# Altium footprint library rescap.PcbLib: 106 footprints (part 5 of 7)
Each footprint in its own frame and in the unit in brackets; x right, y up, seen from the top. Pads: shape width x height; smd on the part's side, far side on the other; paste and mask are expansions set on the pad; w line width, h text height; cw(c..) or ccw(c..) is an arc to the next point about the centre after c.
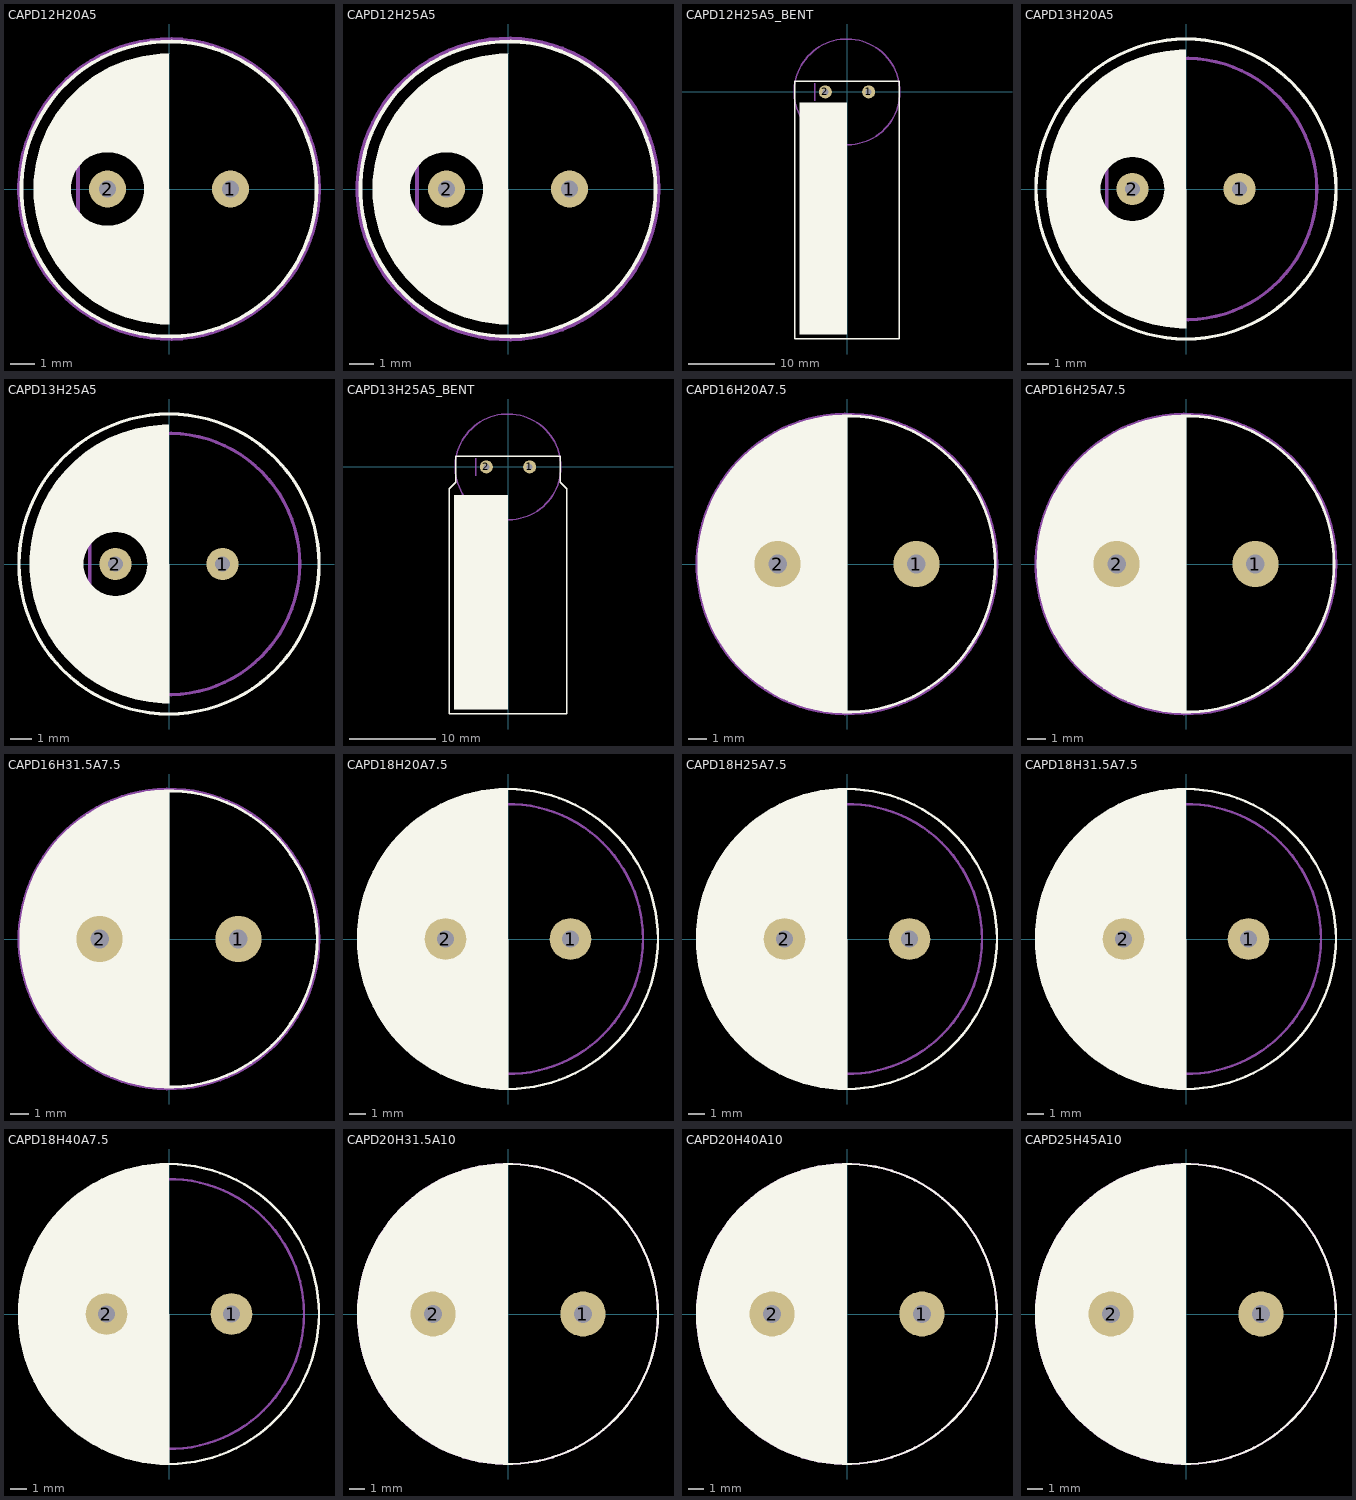
[diagram p4: the footprints below, top view; thin cyan lines are the x and y axes]

## CAPD12H20A5 [mm]
height 20
pads (2):
  round 1.5 hole 0.7: 1(2.5,0) 2(-2.5,0)
Top Overlay:
  circle w0.15: c0,0 r6
  region: 0,5.5 0,-5.5 -0.36,-5.5 -1.075,-5.406 -1.772,-5.219 -2.438,-4.943 -3.062,-4.583 -3.634,-4.144 -4.144,-3.634 -4.583,-3.062 -4.943,-2.438 -5.219,-1.772 -5.406,-1.075 -5.5,-0.36 -5.5,0 -4,0 -3.993,-0.147 -3.935,-0.435 -3.823,-0.707 -3.66,-0.952 -3.452,-1.16 -3.207,-1.323 -2.935,-1.435 -2.647,-1.493 -2.5,-1.5 -2.353,-1.493 -2.065,-1.435 -1.793,-1.323 -1.548,-1.16 -1.34,-0.952 -1.177,-0.707 -1.065,-0.435 -1.007,-0.147 -1,0 -1.007,0.147 -1.065,0.435 -1.177,0.707 -1.34,0.952 -1.548,1.16 -1.793,1.323 -2.065,1.435 -2.353,1.493 -2.5,1.5 -2.647,1.493 -2.935,1.435 -3.207,1.323 -3.452,1.16 -3.66,0.952 -3.823,0.707 -3.935,0.435 -3.993,0.147 -4,0 -5.5,0 -5.5,0.36 -5.406,1.075 -5.219,1.772 -4.943,2.438 -4.583,3.062 -4.144,3.634 -3.634,4.144 -3.062,4.583 -2.438,4.943 -1.772,5.219 -1.075,5.406 -0.36,5.5
Mechanical 29:
  circle w0.15: c0,0 r6.1
  lines w0.15: -3.7,-1 -3.7,0 -3.7,1
  text ".Designator" at -2.8,-0.4 h1
3D body: height 20, standoff 0, extent -6,-6 6,6

## CAPD12H25A5 [mm]
height 25
pads (2):
  round 1.5 hole 0.7: 1(2.5,0) 2(-2.5,0)
Top Overlay:
  circle w0.15: c0,0 r6
  region: 0,5.5 0,-5.5 -0.36,-5.5 -1.075,-5.406 -1.772,-5.219 -2.438,-4.943 -3.062,-4.583 -3.634,-4.144 -4.144,-3.634 -4.583,-3.062 -4.943,-2.438 -5.219,-1.772 -5.406,-1.075 -5.5,-0.36 -5.5,0 -4,0 -3.993,-0.147 -3.935,-0.435 -3.823,-0.707 -3.66,-0.952 -3.452,-1.16 -3.207,-1.323 -2.935,-1.435 -2.647,-1.493 -2.5,-1.5 -2.353,-1.493 -2.065,-1.435 -1.793,-1.323 -1.548,-1.16 -1.34,-0.952 -1.177,-0.707 -1.065,-0.435 -1.007,-0.147 -1,0 -1.007,0.147 -1.065,0.435 -1.177,0.707 -1.34,0.952 -1.548,1.16 -1.793,1.323 -2.065,1.435 -2.353,1.493 -2.5,1.5 -2.647,1.493 -2.935,1.435 -3.207,1.323 -3.452,1.16 -3.66,0.952 -3.823,0.707 -3.935,0.435 -3.993,0.147 -4,0 -5.5,0 -5.5,0.36 -5.406,1.075 -5.219,1.772 -4.943,2.438 -4.583,3.062 -4.144,3.634 -3.634,4.144 -3.062,4.583 -2.438,4.943 -1.772,5.219 -1.075,5.406 -0.36,5.5
Top Courtyard:
  circle w0.2: c0,0 r6.1
Mechanical 29:
  circle w0.15: c0,0 r6.101
  lines w0.15: -3.7,-1 -3.7,0 -3.7,1
  text ".Designator" at -2.6,-0.3 h1
3D body: height 25, standoff 0, extent -6,-6 6,6

## CAPD12H25A5_BENT [mm]
pads (2):
  round 1.5 hole 0.7: 1(2.5,0) 2(-2.5,0)
Top Overlay:
  rectangle: -5.5,-28 0,-1.25
  lines w0.15: -6,-28.5 6,-28.5 6,0.25 6,1.25 -6,1.25 -6,0 -6,-28.5
Mechanical 29:
  circle w0.15: c0,0 r6.101
  lines w0.15: -3.7,-1 -3.7,0 -3.7,1
  text ".Designator" at -2.6,-0.3 h1
3D body: height 12, standoff 0, extent -6,-28.25 6,-3.25
3D body: height 6.35, standoff 5.65, extent -2.85,-3.275 -2.15,-0.075
3D body: height 6.35, standoff 5.65, extent 2.15,-3.275 2.85,-0.075
3D body: height 6.35, standoff -1, extent -2.85,-0.35 -2.15,0.35
3D body: height 6.35, standoff -1, extent 2.15,-0.35 2.85,0.35

## CAPD13H20A5 [mm]
pads (2):
  round 1.5 hole 0.7: 1(2.5,0) 2(-2.5,0)
Top Overlay:
  circle w0.15: c0,0 r7
  region: 0,6.5 0,-6.5 -0.319,-6.5 -0.955,-6.437 -1.581,-6.313 -2.192,-6.127 -2.782,-5.883 -3.346,-5.582 -3.877,-5.227 -4.37,-4.822 -4.822,-4.37 -5.227,-3.877 -5.582,-3.346 -5.883,-2.782 -6.127,-2.192 -6.313,-1.581 -6.437,-0.955 -6.5,-0.319 -6.5,0 -4,0 -3.993,-0.147 -3.935,-0.435 -3.823,-0.707 -3.66,-0.952 -3.452,-1.16 -3.207,-1.323 -2.935,-1.435 -2.647,-1.493 -2.5,-1.5 -2.353,-1.493 -2.065,-1.435 -1.793,-1.323 -1.548,-1.16 -1.34,-0.952 -1.177,-0.707 -1.065,-0.435 -1.007,-0.147 -1,0 -1.007,0.147 -1.065,0.435 -1.177,0.707 -1.34,0.952 -1.548,1.16 -1.793,1.323 -2.065,1.435 -2.353,1.493 -2.5,1.5 -2.647,1.493 -2.935,1.435 -3.207,1.323 -3.452,1.16 -3.66,0.952 -3.823,0.707 -3.935,0.435 -3.993,0.147 -4,0 -6.5,0 -6.5,0.319 -6.437,0.955 -6.313,1.581 -6.127,2.192 -5.883,2.782 -5.582,3.346 -5.227,3.877 -4.822,4.37 -4.37,4.822 -3.877,5.227 -3.346,5.582 -2.782,5.883 -2.192,6.127 -1.581,6.313 -0.955,6.437 -0.319,6.5
Mechanical 29:
  circle w0.15: c0,0 r6.101
  lines w0.15: -3.7,-1 -3.7,0 -3.7,1
  text ".Designator" at -2.6,-0.3 h1
3D body: height 20, standoff 0, extent -6.5,-6.5 6.5,6.5

## CAPD13H25A5 [mm]
pads (2):
  round 1.5 hole 0.7: 1(2.5,0) 2(-2.5,0)
Top Overlay:
  circle w0.15: c0,0 r7
  region: 0,6.5 0,-6.5 -0.319,-6.5 -0.955,-6.437 -1.581,-6.313 -2.192,-6.127 -2.782,-5.883 -3.346,-5.582 -3.877,-5.227 -4.37,-4.822 -4.822,-4.37 -5.227,-3.877 -5.582,-3.346 -5.883,-2.782 -6.127,-2.192 -6.313,-1.581 -6.437,-0.955 -6.5,-0.319 -6.5,0 -4,0 -3.993,-0.147 -3.935,-0.435 -3.823,-0.707 -3.66,-0.952 -3.452,-1.16 -3.207,-1.323 -2.935,-1.435 -2.647,-1.493 -2.5,-1.5 -2.353,-1.493 -2.065,-1.435 -1.793,-1.323 -1.548,-1.16 -1.34,-0.952 -1.177,-0.707 -1.065,-0.435 -1.007,-0.147 -1,0 -1.007,0.147 -1.065,0.435 -1.177,0.707 -1.34,0.952 -1.548,1.16 -1.793,1.323 -2.065,1.435 -2.353,1.493 -2.5,1.5 -2.647,1.493 -2.935,1.435 -3.207,1.323 -3.452,1.16 -3.66,0.952 -3.823,0.707 -3.935,0.435 -3.993,0.147 -4,0 -6.5,0 -6.5,0.319 -6.437,0.955 -6.313,1.581 -6.127,2.192 -5.883,2.782 -5.582,3.346 -5.227,3.877 -4.822,4.37 -4.37,4.822 -3.877,5.227 -3.346,5.582 -2.782,5.883 -2.192,6.127 -1.581,6.313 -0.955,6.437 -0.319,6.5
Mechanical 29:
  circle w0.15: c0,0 r6.101
  lines w0.15: -3.7,-1 -3.7,0 -3.7,1
  text ".Designator" at -2.6,-0.3 h1
3D body: height 25, standoff 0, extent -6.5,-6.5 6.5,6.5

## CAPD13H25A5_BENT [mm]
pads (2):
  round 1.5 hole 0.7: 1(2.5,0) 2(-2.5,0)
Top Overlay:
  rectangle: -6.25,-28 0,-3.25
  lines w0.15: -6.75,-28.5 -6.75,-2.5 -6,-1.75 -6,1.25 6,1.25 6,-1.75 6.75,-2.5 6.75,-28.5 -6.75,-28.5
Mechanical 29:
  circle w0.15: c0,0 r6.101
  lines w0.15: -3.7,-1 -3.7,0 -3.7,1
  text ".Designator" at -2.6,-0.3 h1
3D body: height 6.35, standoff -1, extent 2.15,-0.35 2.85,0.35
3D body: height 6.35, standoff -1, extent -2.85,-0.35 -2.15,0.35
3D body: height 6.35, standoff 5.65, extent 2.15,-3.275 2.85,-0.075
3D body: height 6.35, standoff 5.65, extent -2.85,-3.275 -2.15,-0.075
3D body: height 12.5, standoff -0.5, extent -6.5,-28.25 6.5,-3.25

## CAPD16H20A7.5 [mm]
height 20
pads (2):
  round 2.5 hole 1: 1(3.75,0) 2(-3.75,0)
Top Overlay:
  circle w0.15: c0,0 r8
  region: 0,-8 -0.393,-8 -1.175,-7.923 -1.946,-7.77 -2.698,-7.541 -3.425,-7.241 -4.118,-6.87 -4.771,-6.433 -5.379,-5.935 -5.935,-5.379 -6.433,-4.771 -6.87,-4.118 -7.241,-3.425 -7.541,-2.698 -7.77,-1.946 -7.923,-1.175 -8,-0.393 -8,0 -8,0.393 -7.923,1.175 -7.77,1.946 -7.541,2.698 -7.241,3.425 -6.87,4.118 -6.433,4.771 -5.935,5.379 -5.379,5.935 -4.771,6.433 -4.118,6.87 -3.425,7.241 -2.698,7.541 -1.946,7.77 -1.175,7.923 -0.393,8 0,8
  pour cut-out: -3.75,-1.75 -3.922,-1.75 -4.26,-1.683 -4.579,-1.551 -4.866,-1.359 -5.109,-1.116 -5.301,-0.829 -5.433,-0.51 -5.5,-0.172 -5.5,0 -5.5,0.172 -5.433,0.51 -5.301,0.829 -5.109,1.116 -4.866,1.359 -4.579,1.551 -4.26,1.683 -3.922,1.75 -3.75,1.75 -3.578,1.75 -3.24,1.683 -2.921,1.551 -2.634,1.359 -2.391,1.116 -2.199,0.829 -2.067,0.51 -2,0.172 -2,0 -2,-0.172 -2.067,-0.51 -2.199,-0.829 -2.391,-1.116 -2.634,-1.359 -2.921,-1.551 -3.24,-1.683 -3.578,-1.75
Mechanical 29:
  circle w0.15: c0,0 r8.1
  lines w0.15: -3.7,-1 -3.7,0 -3.7,1
  text ".Designator" at -2.2,-0.4 h1
3D body: height 20, standoff 0, extent -7.999,-7.999 7.999,7.999

## CAPD16H25A7.5 [mm]
height 25
pads (2):
  round 2.5 hole 1: 1(3.75,0) 2(-3.75,0)
Top Overlay:
  circle w0.15: c0,0 r8
  region: 0,-8 -0.393,-8 -1.175,-7.923 -1.946,-7.77 -2.698,-7.541 -3.425,-7.241 -4.118,-6.87 -4.771,-6.433 -5.379,-5.935 -5.935,-5.379 -6.433,-4.771 -6.87,-4.118 -7.241,-3.425 -7.541,-2.698 -7.77,-1.946 -7.923,-1.175 -8,-0.393 -8,0 -8,0.393 -7.923,1.175 -7.77,1.946 -7.541,2.698 -7.241,3.425 -6.87,4.118 -6.433,4.771 -5.935,5.379 -5.379,5.935 -4.771,6.433 -4.118,6.87 -3.425,7.241 -2.698,7.541 -1.946,7.77 -1.175,7.923 -0.393,8 0,8
  pour cut-out: -3.75,-1.75 -3.922,-1.75 -4.26,-1.683 -4.579,-1.551 -4.866,-1.359 -5.109,-1.116 -5.301,-0.829 -5.433,-0.51 -5.5,-0.172 -5.5,0 -5.5,0.172 -5.433,0.51 -5.301,0.829 -5.109,1.116 -4.866,1.359 -4.579,1.551 -4.26,1.683 -3.922,1.75 -3.75,1.75 -3.578,1.75 -3.24,1.683 -2.921,1.551 -2.634,1.359 -2.391,1.116 -2.199,0.829 -2.067,0.51 -2,0.172 -2,0 -2,-0.172 -2.067,-0.51 -2.199,-0.829 -2.391,-1.116 -2.634,-1.359 -2.921,-1.551 -3.24,-1.683 -3.578,-1.75
Mechanical 29:
  circle w0.15: c0,0 r8.101
  lines w0.15: -3.7,-1 -3.7,0 -3.7,1
  text ".Designator" at -2.4,-0.3 h1
3D body: height 25, standoff 0, extent -7.999,-7.999 7.999,7.999

## CAPD16H31.5A7.5 [mm]
height 31.5
pads (2):
  round 2.5 hole 1: 1(3.75,0) 2(-3.75,0)
Top Overlay:
  circle w0.15: c0,0 r8
  region: 0,-8 -0.393,-8 -1.175,-7.923 -1.946,-7.77 -2.698,-7.541 -3.425,-7.241 -4.118,-6.87 -4.771,-6.433 -5.379,-5.935 -5.935,-5.379 -6.433,-4.771 -6.87,-4.118 -7.241,-3.425 -7.541,-2.698 -7.77,-1.946 -7.923,-1.175 -8,-0.393 -8,0 -8,0.393 -7.923,1.175 -7.77,1.946 -7.541,2.698 -7.241,3.425 -6.87,4.118 -6.433,4.771 -5.935,5.379 -5.379,5.935 -4.771,6.433 -4.118,6.87 -3.425,7.241 -2.698,7.541 -1.946,7.77 -1.175,7.923 -0.393,8 0,8
  pour cut-out: -3.75,-1.75 -3.922,-1.75 -4.26,-1.683 -4.579,-1.551 -4.866,-1.359 -5.109,-1.116 -5.301,-0.829 -5.433,-0.51 -5.5,-0.172 -5.5,0 -5.5,0.172 -5.433,0.51 -5.301,0.829 -5.109,1.116 -4.866,1.359 -4.579,1.551 -4.26,1.683 -3.922,1.75 -3.75,1.75 -3.578,1.75 -3.24,1.683 -2.921,1.551 -2.634,1.359 -2.391,1.116 -2.199,0.829 -2.067,0.51 -2,0.172 -2,0 -2,-0.172 -2.067,-0.51 -2.199,-0.829 -2.391,-1.116 -2.634,-1.359 -2.921,-1.551 -3.24,-1.683 -3.578,-1.75
Mechanical 29:
  circle w0.15: c0,0 r8.1
  lines w0.15: -3.7,-1 -3.7,0 -3.7,1
  text ".Designator" at -2.3,-0.2 h1
3D body: height 31.5, standoff 0, extent -7.999,-7.999 7.999,7.999

## CAPD18H20A7.5 [mm]
height 20
pads (2):
  round 2.5 hole 1: 1(3.75,0) 2(-3.75,0)
Top Overlay:
  circle w0.15: c0,0 r9
  pour cut-out: -3.75,-1.75 -3.922,-1.75 -4.26,-1.683 -4.579,-1.551 -4.866,-1.359 -5.109,-1.116 -5.301,-0.829 -5.433,-0.51 -5.5,-0.172 -5.5,0 -5.5,0.172 -5.433,0.51 -5.301,0.829 -5.109,1.116 -4.866,1.359 -4.579,1.551 -4.26,1.683 -3.922,1.75 -3.75,1.75 -3.578,1.75 -3.24,1.683 -2.921,1.551 -2.634,1.359 -2.391,1.116 -2.199,0.829 -2.067,0.51 -2,0.172 -2,0 -2,-0.172 -2.067,-0.51 -2.199,-0.829 -2.391,-1.116 -2.634,-1.359 -2.921,-1.551 -3.24,-1.683 -3.578,-1.75
  region: 0,-9 -0.442,-9 -1.322,-8.913 -2.189,-8.741 -3.036,-8.484 -3.853,-8.146 -4.633,-7.729 -5.368,-7.238 -6.051,-6.677 -6.677,-6.051 -7.238,-5.368 -7.729,-4.633 -8.146,-3.853 -8.484,-3.036 -8.741,-2.189 -8.913,-1.322 -9,-0.442 -9,0 -9,0.442 -8.913,1.322 -8.741,2.189 -8.484,3.036 -8.146,3.853 -7.729,4.632 -7.238,5.368 -6.677,6.051 -6.051,6.677 -5.368,7.238 -4.633,7.729 -3.853,8.146 -3.036,8.484 -2.189,8.741 -1.322,8.913 -0.442,9 0,9
Mechanical 29:
  circle w0.15: c0,0 r8.1
  lines w0.15: -3.7,-1 -3.7,0 -3.7,1
  text ".Designator" at -2.2,-0.4 h1
3D body: height 20, standoff 0, extent -9,-9 9,9

## CAPD18H25A7.5 [mm]
height 25
pads (2):
  round 2.5 hole 1: 1(3.75,0) 2(-3.75,0)
Top Overlay:
  circle w0.15: c0,0 r9
  pour cut-out: -3.75,-1.75 -3.922,-1.75 -4.26,-1.683 -4.579,-1.551 -4.866,-1.359 -5.109,-1.116 -5.301,-0.829 -5.433,-0.51 -5.5,-0.172 -5.5,0 -5.5,0.172 -5.433,0.51 -5.301,0.829 -5.109,1.116 -4.866,1.359 -4.579,1.551 -4.26,1.683 -3.922,1.75 -3.75,1.75 -3.578,1.75 -3.24,1.683 -2.921,1.551 -2.634,1.359 -2.391,1.116 -2.199,0.829 -2.067,0.51 -2,0.172 -2,0 -2,-0.172 -2.067,-0.51 -2.199,-0.829 -2.391,-1.116 -2.634,-1.359 -2.921,-1.551 -3.24,-1.683 -3.578,-1.75
  region: 0,-9 -0.442,-9 -1.322,-8.913 -2.189,-8.741 -3.036,-8.484 -3.853,-8.146 -4.633,-7.729 -5.368,-7.238 -6.051,-6.677 -6.677,-6.051 -7.238,-5.368 -7.729,-4.633 -8.146,-3.853 -8.484,-3.036 -8.741,-2.189 -8.913,-1.322 -9,-0.442 -9,0 -9,0.442 -8.913,1.322 -8.741,2.189 -8.484,3.036 -8.146,3.853 -7.729,4.632 -7.238,5.368 -6.677,6.051 -6.051,6.677 -5.368,7.238 -4.633,7.729 -3.853,8.146 -3.036,8.484 -2.189,8.741 -1.322,8.913 -0.442,9 0,9
Mechanical 29:
  circle w0.15: c0,0 r8.1
  lines w0.15: -3.7,-1 -3.7,0 -3.7,1
  text ".Designator" at -2.2,-0.4 h1
3D body: height 25, standoff 0, extent -9,-9 9,9

## CAPD18H31.5A7.5 [mm]
height 25
pads (2):
  round 2.5 hole 1: 1(3.75,0) 2(-3.75,0)
Top Overlay:
  circle w0.15: c0,0 r9
  pour cut-out: -3.75,-1.75 -3.922,-1.75 -4.26,-1.683 -4.579,-1.551 -4.866,-1.359 -5.109,-1.116 -5.301,-0.829 -5.433,-0.51 -5.5,-0.172 -5.5,0 -5.5,0.172 -5.433,0.51 -5.301,0.829 -5.109,1.116 -4.866,1.359 -4.579,1.551 -4.26,1.683 -3.922,1.75 -3.75,1.75 -3.578,1.75 -3.24,1.683 -2.921,1.551 -2.634,1.359 -2.391,1.116 -2.199,0.829 -2.067,0.51 -2,0.172 -2,0 -2,-0.172 -2.067,-0.51 -2.199,-0.829 -2.391,-1.116 -2.634,-1.359 -2.921,-1.551 -3.24,-1.683 -3.578,-1.75
  region: 0,-9 -0.442,-9 -1.322,-8.913 -2.189,-8.741 -3.036,-8.484 -3.853,-8.146 -4.633,-7.729 -5.368,-7.238 -6.051,-6.677 -6.677,-6.051 -7.238,-5.368 -7.729,-4.633 -8.146,-3.853 -8.484,-3.036 -8.741,-2.189 -8.913,-1.322 -9,-0.442 -9,0 -9,0.442 -8.913,1.322 -8.741,2.189 -8.484,3.036 -8.146,3.853 -7.729,4.632 -7.238,5.368 -6.677,6.051 -6.051,6.677 -5.368,7.238 -4.633,7.729 -3.853,8.146 -3.036,8.484 -2.189,8.741 -1.322,8.913 -0.442,9 0,9
Mechanical 29:
  circle w0.15: c0,0 r8.1
  lines w0.15: -3.7,-1 -3.7,0 -3.7,1
  text ".Designator" at -2.2,-0.4 h1
3D body: height 31.5, standoff 0, extent -9,-9 9,9

## CAPD18H40A7.5 [mm]
height 25
pads (2):
  round 2.5 hole 1: 1(3.75,0) 2(-3.75,0)
Top Overlay:
  circle w0.15: c0,0 r9
  pour cut-out: -3.75,-1.75 -3.922,-1.75 -4.26,-1.683 -4.579,-1.551 -4.866,-1.359 -5.109,-1.116 -5.301,-0.829 -5.433,-0.51 -5.5,-0.172 -5.5,0 -5.5,0.172 -5.433,0.51 -5.301,0.829 -5.109,1.116 -4.866,1.359 -4.579,1.551 -4.26,1.683 -3.922,1.75 -3.75,1.75 -3.578,1.75 -3.24,1.683 -2.921,1.551 -2.634,1.359 -2.391,1.116 -2.199,0.829 -2.067,0.51 -2,0.172 -2,0 -2,-0.172 -2.067,-0.51 -2.199,-0.829 -2.391,-1.116 -2.634,-1.359 -2.921,-1.551 -3.24,-1.683 -3.578,-1.75
  region: 0,-9 -0.442,-9 -1.322,-8.913 -2.189,-8.741 -3.036,-8.484 -3.853,-8.146 -4.633,-7.729 -5.368,-7.238 -6.051,-6.677 -6.677,-6.051 -7.238,-5.368 -7.729,-4.633 -8.146,-3.853 -8.484,-3.036 -8.741,-2.189 -8.913,-1.322 -9,-0.442 -9,0 -9,0.442 -8.913,1.322 -8.741,2.189 -8.484,3.036 -8.146,3.853 -7.729,4.632 -7.238,5.368 -6.677,6.051 -6.051,6.677 -5.368,7.238 -4.633,7.729 -3.853,8.146 -3.036,8.484 -2.189,8.741 -1.322,8.913 -0.442,9 0,9
Mechanical 29:
  circle w0.15: c0,0 r8.1
  lines w0.15: -3.7,-1 -3.7,0 -3.7,1
  text ".Designator" at -2.2,-0.4 h1
3D body: height 40, standoff 0, extent -9,-9 9,9

## CAPD20H31.5A10 [mm]
height 31.5
pads (2):
  round 3 hole 1.2: 1(5,0) 2(-5,0)
Top Overlay:
  circle w0.15: c0,0 r10
  pour cut-out: -5,-1.75 -5.172,-1.75 -5.51,-1.683 -5.829,-1.551 -6.116,-1.359 -6.359,-1.116 -6.551,-0.829 -6.683,-0.51 -6.75,-0.172 -6.75,0 -6.75,0.172 -6.683,0.51 -6.551,0.829 -6.359,1.116 -6.116,1.359 -5.829,1.551 -5.51,1.683 -5.172,1.75 -5,1.75 -4.828,1.75 -4.49,1.683 -4.171,1.551 -3.884,1.359 -3.641,1.116 -3.449,0.829 -3.317,0.51 -3.25,0.172 -3.25,0 -3.25,-0.172 -3.317,-0.51 -3.449,-0.829 -3.641,-1.116 -3.884,-1.359 -4.171,-1.551 -4.49,-1.683 -4.828,-1.75
  region: 0,-10 -0.491,-10 -1.469,-9.904 -2.433,-9.712 -3.373,-9.427 -4.281,-9.051 -5.147,-8.588 -5.964,-8.042 -6.724,-7.418 -7.418,-6.724 -8.042,-5.964 -8.588,-5.147 -9.051,-4.281 -9.427,-3.373 -9.712,-2.433 -9.904,-1.469 -10,-0.491 -10,0 -10,0.491 -9.904,1.469 -9.712,2.433 -9.427,3.373 -9.051,4.281 -8.588,5.147 -8.042,5.964 -7.418,6.724 -6.724,7.418 -5.964,8.042 -5.147,8.588 -4.281,9.051 -3.373,9.427 -2.433,9.712 -1.469,9.904 -0.491,10 0,10
Mechanical 29:
  circle w0.15: c0,0 r10.002
  lines w0.15: -6.1,-1 -6.1,0 -6.1,1
  text ".Designator" at -2.6,-0.4 h1
3D body: height 31.5, standoff 0, extent -10,-10 10,10

## CAPD20H40A10 [mm]
height 40
pads (2):
  round 3 hole 1.2: 1(5,0) 2(-5,0)
Top Overlay:
  circle w0.15: c0,0 r10
  region: 0,-10 -0.491,-10 -1.469,-9.904 -2.433,-9.712 -3.373,-9.427 -4.281,-9.051 -5.147,-8.588 -5.964,-8.042 -6.724,-7.418 -7.418,-6.724 -8.042,-5.964 -8.588,-5.147 -9.051,-4.281 -9.427,-3.373 -9.712,-2.433 -9.904,-1.469 -10,-0.491 -10,0 -10,0.491 -9.904,1.469 -9.712,2.433 -9.427,3.373 -9.051,4.281 -8.588,5.147 -8.042,5.964 -7.418,6.724 -6.724,7.418 -5.964,8.042 -5.147,8.588 -4.281,9.051 -3.373,9.427 -2.433,9.712 -1.469,9.904 -0.491,10 0,10
  pour cut-out: -5,-1.75 -5.172,-1.75 -5.51,-1.683 -5.829,-1.551 -6.116,-1.359 -6.359,-1.116 -6.551,-0.829 -6.683,-0.51 -6.75,-0.172 -6.75,0 -6.75,0.172 -6.683,0.51 -6.551,0.829 -6.359,1.116 -6.116,1.359 -5.829,1.551 -5.51,1.683 -5.172,1.75 -5,1.75 -4.828,1.75 -4.49,1.683 -4.171,1.551 -3.884,1.359 -3.641,1.116 -3.449,0.829 -3.317,0.51 -3.25,0.172 -3.25,0 -3.25,-0.172 -3.317,-0.51 -3.449,-0.829 -3.641,-1.116 -3.884,-1.359 -4.171,-1.551 -4.49,-1.683 -4.828,-1.75
Mechanical 29:
  circle w0.15: c0,0 r10.002
  lines w0.15: -6.1,-1 -6.1,0 -6.1,1
  text ".Designator" at -3.3,-0.5 h1
3D body: height 40, standoff 0, extent -10,-10 10,10

## CAPD25H45A10 [mm]
height 45
pads (2):
  round 3 hole 1.2: 1(5,0) 2(-5,0)
Top Overlay:
  circle w0.15: c0,0 r10
  pour cut-out: -5,-1.75 -5.172,-1.75 -5.51,-1.683 -5.829,-1.551 -6.116,-1.359 -6.359,-1.116 -6.551,-0.829 -6.683,-0.51 -6.75,-0.172 -6.75,0 -6.75,0.172 -6.683,0.51 -6.551,0.829 -6.359,1.116 -6.116,1.359 -5.829,1.551 -5.51,1.683 -5.172,1.75 -5,1.75 -4.828,1.75 -4.49,1.683 -4.171,1.551 -3.884,1.359 -3.641,1.116 -3.449,0.829 -3.317,0.51 -3.25,0.172 -3.25,0 -3.25,-0.172 -3.317,-0.51 -3.449,-0.829 -3.641,-1.116 -3.884,-1.359 -4.171,-1.551 -4.49,-1.683 -4.828,-1.75
  region: 0,-10 -0.491,-10 -1.469,-9.904 -2.433,-9.712 -3.373,-9.427 -4.281,-9.051 -5.147,-8.588 -5.964,-8.042 -6.724,-7.418 -7.418,-6.724 -8.042,-5.964 -8.588,-5.147 -9.051,-4.281 -9.427,-3.373 -9.712,-2.433 -9.904,-1.469 -10,-0.491 -10,0 -10,0.491 -9.904,1.469 -9.712,2.433 -9.427,3.373 -9.051,4.281 -8.588,5.147 -8.042,5.964 -7.418,6.724 -6.724,7.418 -5.964,8.042 -5.147,8.588 -4.281,9.051 -3.373,9.427 -2.433,9.712 -1.469,9.904 -0.491,10 0,10
Mechanical 29:
  circle w0.15: c0,0 r10.002
  lines w0.15: -6.1,-1 -6.1,0 -6.1,1
  text ".Designator" at -3.8,-0.3 h1
3D body: height 45, standoff 0, extent -10,-10 10,10